# Altium footprint library MyComponents_v2.5.PcbLib: 403 footprints (part 24 of 26)
Each footprint in its own frame and in the unit in brackets; x right, y up, seen from the top. Pads: shape width x height; smd on the part's side, far side on the other; paste and mask are expansions set on the pad; w line width, h text height; cw(c..) or ccw(c..) is an arc to the next point about the centre after c.
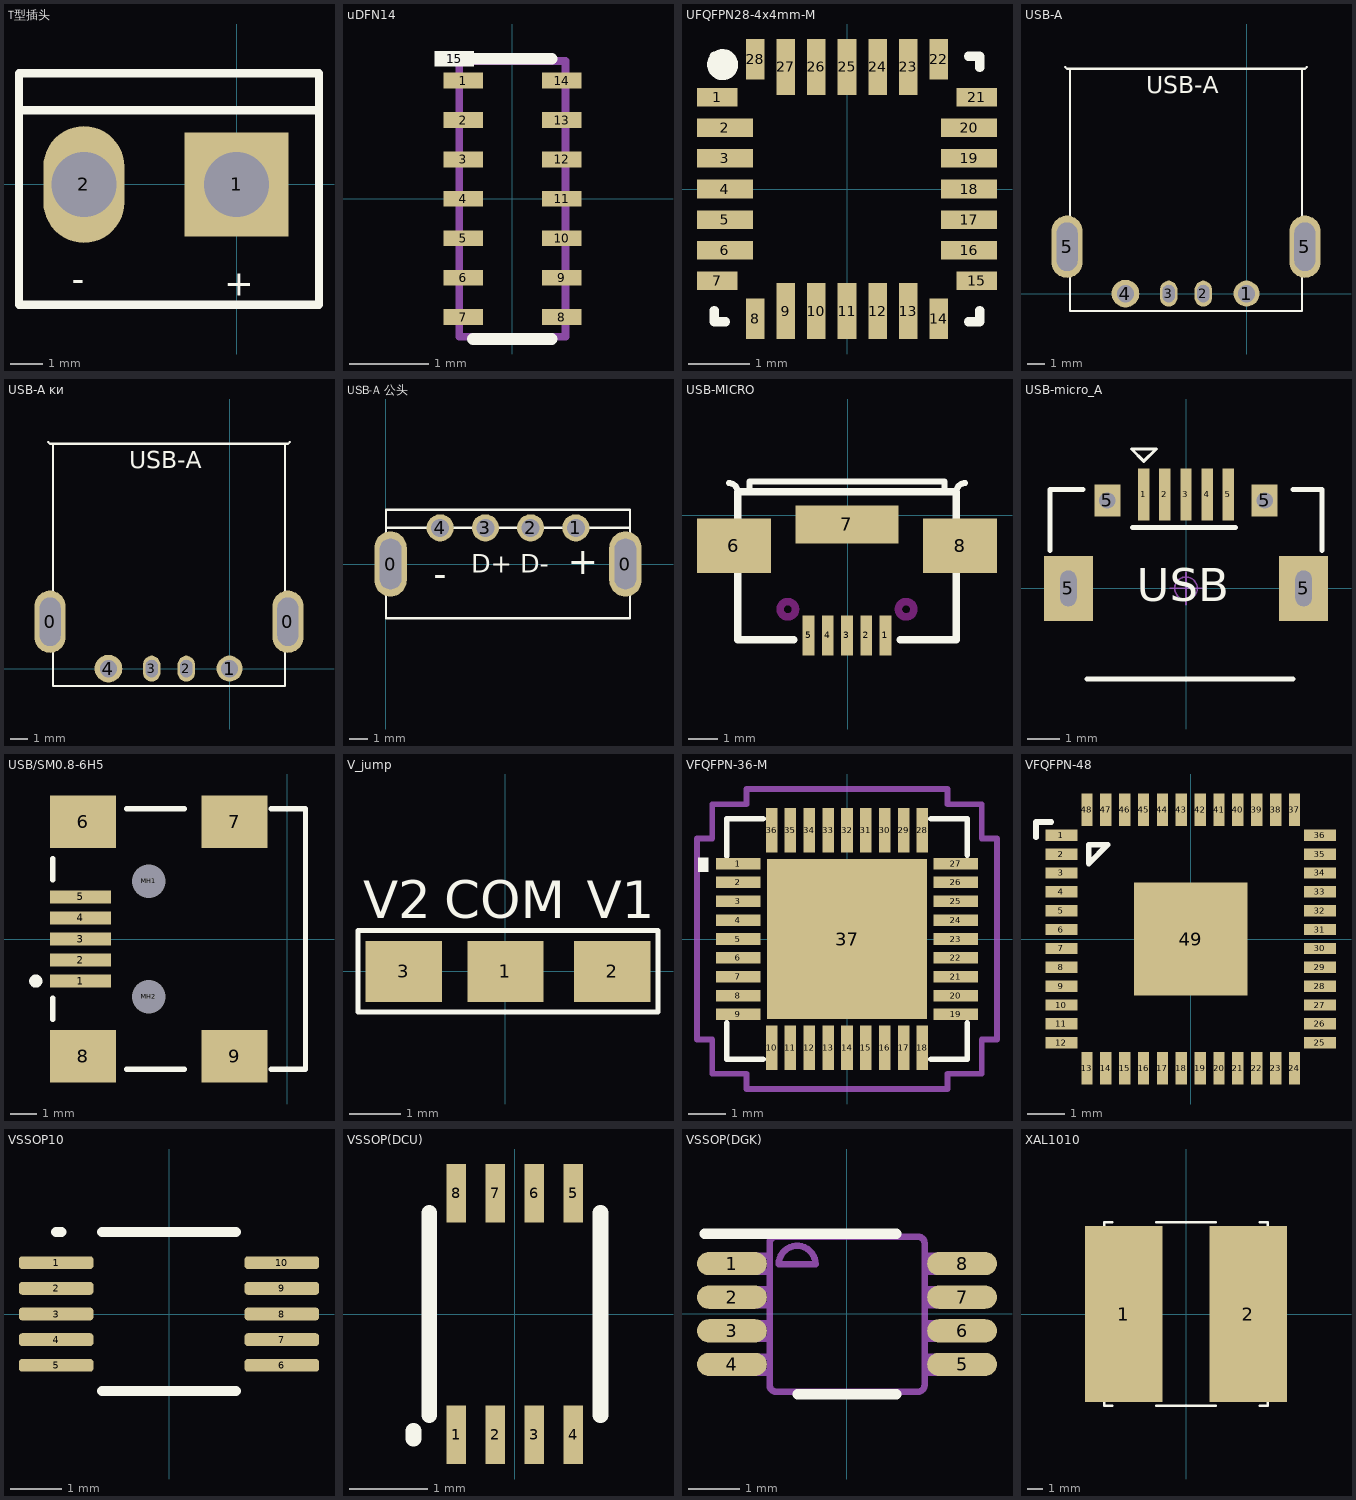
[diagram p23: the footprints below, top view; thin cyan lines are the x and y axes]

## T型插头 [mm]
pads (2):
  rect 3.2x3.2 hole 2: 1(0,0)
  oval 2.5x3.6 hole 2: 2(-4.699,0)
Top Overlay:
  lines w0.254: -6.7,2.286 2.54,2.286 ; -6.7,3.427 -6.7,-3.708 2.54,-3.708 2.54,3.429 -6.7,3.429
  text "+" at -0.381,-3.429 h0.8
  text "-" at -5.08,-3.302 h0.8

## uDFN14 [mm]
pads (15):
  rect 0.5x0.2 smd: 1(-0.625,1.5) 2(-0.625,1) 3(-0.625,0.5) 4(-0.625,0) 5(-0.625,-0.5) 6(-0.625,-1) 7(-0.625,-1.5) 8(0.625,-1.5) 9(0.625,-1) 10(0.625,-0.5) 11(0.625,0) 12(0.625,0.5) 13(0.625,1) 14(0.625,1.5)
  rect 0.5x0.2 on Top Overlay: 15(-0.737,1.778)
Top Overlay:
  lines w0.15: -0.8,1.778 0.5,1.778 ; -0.5,-1.778 0.5,-1.778
Mechanical 13:
  lines w0.1: -0.675,-1.75 0.675,-1.75 0.675,1.75 -0.675,1.75 -0.675,-1.75
3D body: height 0.5, standoff 0.1, extent -0.675,-1.75 0.675,1.75

## UFQFPN28-4x4mm-M [mil]
pads (28):
  rect 26x12 smd paste+0 mask+0: 1(-83.5,59.06) 7(-83.5,-59.06) 15(83.5,-59.06) 21(83.5,59.06)
  rect 36x12 smd paste+0 mask+0: 2(-78.5,39.37) 3(-78.5,19.68) 4(-78.5,0) 5(-78.5,-19.68) 6(-78.5,-39.37) 16(78.5,-39.37) 17(78.5,-19.68) 18(78.5,0) 19(78.5,19.68) 20(78.5,39.37)
  rect 12x26 smd paste+0 mask+0: 8(-59.06,-83.5) 14(59.06,-83.5) 22(59.06,83.5) 28(-59.06,83.5)
  rect 12x36 smd paste+0 mask+0: 9(-39.37,-78.5) 10(-19.68,-78.5) 11(0,-78.5) 12(19.68,-78.5) 13(39.37,-78.5) 23(39.37,78.5) 24(19.68,78.5) 25(0,78.5) 26(-19.68,78.5) 27(-39.37,78.5)
Top Overlay:
  circle w10: c-80,80 r5
  lines w6: -85.5,-78.16 -85.5,-85.5 -78.16,-85.5 ; -85.5,78.16 -85.5,85.5 -78.16,85.5 ; 78.16,-85.5 85.5,-85.5 85.5,-78.16 ; 78.16,85.5 85.5,85.5 85.5,78.16
3D body "UFQFPN28.step": height 21.65, standoff -0.98, extent -78.5,-79.13 79.77,79.14

## USB-A [mm]
pads (6):
  round 1.5 hole 1: 1(0,0)
  oval 1x1.5 hole 0.7 slot 1 at 90 deg: 2(-2.5,0) 3(-4.5,0)
  round 1.6 hole 1: 4(-7,0)
  oval 1.8x3.6 hole 1.2 slot 2.8 at 90 deg: 5(-10.373,2.71) 5(3.373,2.71)
Top Overlay:
  lines w0.127: -10.485,13.097 -10.388,13 -10.3,13 -10.2,13 ; 3.485,13.097 3.388,13 3.3,13 3.2,13 ; -10.2,13 -10.2,-1 3.2,-1 3.2,13 ; -10.2,13 3.2,13
  text "USB-A" at -5.786,11.573 h1
Bottom Overlay:
  text "GND" at -6.294,1.032 h0.5
  text "D+" at -4.262,1.032 h0.5
  text "D-" at -2.23,1.032 h0.5
  text "VCC" at 0.564,1.032 h0.5

## USB-A ĸͷ [mm]
pads (6):
  oval 1.8x3.6 hole 1.2 slot 2.8 at 90 deg: 0(-10.373,2.71) 0(3.373,2.71)
  round 1.5 hole 1: 1(0,0)
  oval 1x1.5 hole 0.7 slot 1 at 90 deg: 2(-2.5,0) 3(-4.5,0)
  round 1.6 hole 1: 4(-7,0)
Top Overlay:
  lines w0.127: -10.485,13.097 -10.388,13 -10.3,13 -10.2,13 ; 3.485,13.097 3.388,13 3.3,13 3.2,13 ; -10.2,13 -10.2,-1 3.2,-1 3.2,13 ; -10.2,13 3.2,13
  text "USB-A" at -5.786,11.573 h1
Bottom Overlay:
  text "GND" at -6.294,1.032 h0.5
  text "D+" at -4.262,1.032 h0.5
  text "D-" at -2.23,1.032 h0.5
  text "VCC" at 0.564,1.032 h0.5

## USB-A 公头 [mm]
pads (6):
  oval 1.8x3.6 hole 1.2 slot 2.8 at 90 deg: 0(0.254,0) 0(13.246,0)
  round 1.5 hole 1: 1(10.5,2) 2(8,2) 3(5.5,2) 4(3,2)
Top Overlay:
  lines w0.127: 0,2 13.5,2 ; 0,2 0,3 13.5,3 13.5,2 ; 0,2 0,-3 13.5,-3 13.5,2
  text "-" at 3.353,0.32 h2.54
  text "D+" at 4.724,-0.838 h1.78
  text "D-" at 7.417,-0.838 h1.78
  text "+" at 10.058,-1.069 h2.54
3D body "USB-A.stp": height 4.5, standoff -1.3, extent 0.4,-17.803 13.005,2.122

## USB-MICRO [mm]
pads (8):
  rect 0.4x1.35 smd: 1(1.27,-4.064) 2(0.62,-4.064) 3(-0.03,-4.064) 4(-0.68,-4.064) 5(-1.33,-4.064)
  rect 2.5x1.85 smd: 6(-3.855,-1.034) 8(3.795,-1.034)
  rect 3.5x1.3 smd: 7(-0.03,-0.314)
Top Overlay:
  lines w0.2: -4.03,1.086 cw(c-4.03,0.786) -3.73,0.786 ; -3.33,0.786 -3.33,1.136 3.27,1.136 3.27,0.786 ; 3.67,0.786 cw(c3.97,0.786) 3.97,1.086
  lines w0.254: -1.83,-4.214 -3.73,-4.214 -3.73,0.786 3.67,0.786 3.67,-4.214 1.77,-4.214
Bottom Overlay:
  lines w0.254: -4.13,0.586 4.07,0.586 ; -4.13,-4.214 4.07,-4.214 4.07,1.186 -4.13,1.186 -4.13,-4.214
Keep-Out Layer:
  circle w0.254: c-2.03,-3.184 r0.26
  circle w0.254: c1.97,-3.184 r0.26

## USB-micro_A [mm] "micro型USB ，5.7*7.8*2.5mm"
pads (9):
  rect 0.35x1.6 smd: 1(-1.3,2.9) 2(-0.65,2.9) 3(0,2.9) 4(0.65,2.9) 5(1.3,2.9)
  rect 1.5x2 hole 0.5 slot 1.1 at 90 deg: 5(-3.625,0) 5(3.625,0)
  rect 0.8x1 hole 0.5: 5(-2.425,2.71) 5(2.425,2.71)
Top Overlay:
  lines w0.1: -1.681,4.297 -1.3,3.916 -0.919,4.297 -1.681,4.297
  lines w0.152: -4.191,1.168 -4.191,3.048 -3.175,3.048 ; -3.048,-2.794 3.302,-2.794 ; -1.65,1.875 1.525,1.875 ; 3.302,3.048 4.191,3.048 4.191,1.168
  text "USB" at -1.524,-0.402 h1.02
Mechanical 15:
  circle w0.05: c0,0 r0.35
  lines w0.05: -0.5,0 0.5,0 ; 0,-0.5 0,0.5
3D body "USB micro_A.STEP": height 2.8, standoff -0.95, extent -4.001,-2.71 4.001,2.89

## USB/SM0.8-6H5 [mm]
pads (11):
  rect 2.3x0.5 smd: 1(-7.85,-1.6) 2(-7.85,-0.8) 3(-7.85,0) 4(-7.85,0.8) 5(-7.85,1.6)
  rect 2.5x2 smd: 6(-7.75,4.45) 7(-1.996,4.45) 8(-7.75,-4.45) 9(-1.996,-4.45)
  round 0.6 hole 1.27 unplated: MH1(-5.25,2.2) MH2(-5.25,-2.2)
Top Overlay:
  circle w0.25: c-9.55,-1.6 r0.125
  lines w0.2: -8.9,-3.05 -8.9,-2.25 ; -8.9,2.25 -8.9,3.05 ; -6.1,-4.95 -3.9,-4.95 ; -6.1,4.95 -3.9,4.95 ; -0.6,-4.95 0.7,-4.95 0.7,4.95 -0.6,4.95

## V_jump [mm]
pads (3):
  rect 1.5x1.2 smd: 1(0,0) 2(2.1,0) 3(-2,0)
Top Overlay:
  lines w0.1: -2.9,-0.8 3,-0.8 3,0.8 -2.9,0.8 -2.9,-0.8
  text "COM" at -1.2,0.8 h1.27
  text "V2" at -2.8,0.8 h1.27
  text "V1" at 1.6,0.8 h1.27

## VFQFPN-36-M [mil]
pads (37):
  rect 46x12 smd: 1(-113.5,78.74) 2(-113.5,59.06) 3(-113.5,39.37) 4(-113.5,19.68) 5(-113.5,0) 6(-113.5,-19.68) 7(-113.5,-39.37) 8(-113.5,-59.06) 9(-113.5,-78.74) 19(113.5,-78.74) 20(113.5,-59.06) 21(113.5,-39.37) 22(113.5,-19.68) 23(113.5,0) 24(113.5,19.68) 25(113.5,39.37) 26(113.5,59.06) 27(113.5,78.74)
  rect 12x46 smd: 10(-78.74,-113.5) 11(-59.06,-113.5) 12(-39.37,-113.5) 13(-19.68,-113.5) 14(0,-113.5) 15(19.68,-113.5) 16(39.37,-113.5) 17(59.06,-113.5) 18(78.74,-113.5) 28(78.74,113.5) 29(59.06,113.5) 30(39.37,113.5) 31(19.68,113.5) 32(0,113.5) 33(-19.68,113.5) 34(-39.37,113.5) 35(-59.06,113.5) 36(-78.74,113.5)
  rect 167x167 smd paste-83: 37(0,0)
Top Overlay:
  region: -155,85 -145,85 -145,70 -155,70
  lines w6: -125.5,-87.74 -125.5,-125.5 -87.74,-125.5 ; -125.5,86.61 -125.5,125.5 -87.74,125.5 ; 87.74,-125.5 125.5,-125.5 125.5,-87.74 ; 87.74,125.5 125.5,125.5 125.5,87.74
Top Paste:
  region: -31.77,79.56 -79.56,79.56 -79.56,31.77 -31.77,31.77
  region: -31.77,23.9 -79.56,23.9 -79.56,-23.9 -31.77,-23.9
  region: -31.77,-31.77 -79.56,-31.77 -79.56,-79.56 -31.77,-79.56
  region: 23.9,79.56 -23.9,79.56 -23.9,31.77 23.9,31.77
  region: 23.9,23.9 -23.9,23.9 -23.9,-23.9 23.9,-23.9
  region: 23.9,-31.77 -23.9,-31.77 -23.9,-79.56 23.9,-79.56
  region: 79.56,79.56 31.77,79.56 31.77,31.77 79.56,31.77
  region: 79.56,23.9 31.77,23.9 31.77,-23.9 79.56,-23.9
  region: 79.56,-31.77 31.77,-31.77 31.77,-79.56 79.56,-79.56
Mechanical 15:
  lines w6: -156.5,-104.74 -140.5,-104.74 -140.5,-140.5 -104.74,-140.5 -104.74,-156.5 104.74,-156.5 104.74,-140.5 140.5,-140.5 140.5,-104.74 156.5,-104.74 156.5,104.74 140.5,104.74 140.5,140.5 104.74,140.5 104.74,156.5 -104.74,156.5 -104.74,140.5 -140.5,140.5 -140.5,104.74 -156.5,104.74 -156.5,-104.74
3D body "VFQFPN-36-M.stp": height 37.1, standoff 0, extent -122.5,-122.5 122.5,122.5

## VFQFPN-48 [mm]
pads (49):
  rect 0.85x0.3 smd: 1(-3.425,2.75) 2(-3.425,2.25) 3(-3.425,1.75) 4(-3.425,1.25) 5(-3.425,0.75) 6(-3.425,0.25) 7(-3.425,-0.25) 8(-3.425,-0.75) 9(-3.425,-1.25) 10(-3.425,-1.75) 11(-3.425,-2.25) 12(-3.425,-2.75) 25(3.425,-2.75) 26(3.425,-2.25) 27(3.425,-1.75) 28(3.425,-1.25) 29(3.425,-0.75) 30(3.425,-0.25) 31(3.425,0.25) 32(3.425,0.75) 33(3.425,1.25) 34(3.425,1.75) 35(3.425,2.25) 36(3.425,2.75)
  rect 0.3x0.85 smd: 13(-2.75,-3.425) 14(-2.25,-3.425) 15(-1.75,-3.425) 16(-1.25,-3.425) 17(-0.75,-3.425) 18(-0.25,-3.425) 19(0.25,-3.425) 20(0.75,-3.425) 21(1.25,-3.425) 22(1.75,-3.425) 23(2.25,-3.425) 24(2.75,-3.425) 37(2.75,3.425) 38(2.25,3.425) 39(1.75,3.425) 40(1.25,3.425) 41(0.75,3.425) 42(0.25,3.425) 43(-0.25,3.425) 44(-0.75,3.425) 45(-1.25,3.425) 46(-1.75,3.425) 47(-2.25,3.425) 48(-2.75,3.425)
  rect 3x3 smd: 49(0,0)
Top Overlay:
  lines w0.15: -4.1,2.7 -4.1,3.1 -3.7,3.1 ; -2.7,2 -2.7,2.5 -2.2,2.5 -2.7,2
3D body "ALSRobot-QFN48 7x7.step": height 0.78, standoff -0.02, extent -3.51,-3.509 3.51,3.511

## VSSOP10 [mm]
pads (10):
  rrect50% 1.45x0.25 smd: 1(-2.2,1) 2(-2.2,0.5) 3(-2.2,0) 4(-2.2,-0.5) 5(-2.2,-1) 6(2.2,-1) 7(2.2,-0.5) 8(2.2,0) 9(2.2,0.5) 10(2.2,1)
Top Overlay:
  lines w0.2: -2.2,1.6 -2.1,1.6 ; -1.3,-1.5 1.3,-1.5 ; -1.3,1.6 1.3,1.6
3D body "VSSOP10.stp": height 1.06, standoff -0.04, extent -2.45,-1.51 2.475,1.49

## VSSOP(DCU) [mm] "TS5A3359"
height 0.9
pads (8):
  rect 0.25x0.75 smd: 1(-0.75,-1.55) 2(-0.25,-1.55) 3(0.25,-1.55) 4(0.75,-1.55) 5(0.75,1.55) 6(0.25,1.55) 7(-0.25,1.55) 8(-0.75,1.55)
Top Overlay:
  lines w0.2: -1.3,-1.6 -1.3,-1.5 ; -1.1,-1.3 -1.1,1.3 ; 1.1,-1.3 1.1,1.3
3D body "VSSOP.step": height 0.9, standoff 0, extent -1.05,-1.625 1.05,1.575

## VSSOP(DGK) [mm]
pads (8):
  oval 1.35x0.45 smd paste+0 mask+0: 1(-2.225,0.975) 2(-2.225,0.325) 3(-2.225,-0.325) 4(-2.225,-0.975) 5(2.225,-0.975) 6(2.225,-0.325) 7(2.225,0.325) 8(2.225,0.975)
Top Overlay:
  lines w0.2: -2.75,1.55 0.95,1.55 ; -0.95,-1.55 0.95,-1.55
Mechanical 13:
  lines w0.127: -2.45,-1.131 -2.45,-0.826 -2.21,-0.826 -2.091,-0.826 -2.087,-0.826 -1.784,-0.826 -1.498,-0.826 -1.498,-1.131 -1.784,-1.131 -2.087,-1.131 -2.091,-1.131 -2.21,-1.131 -2.45,-1.131 ; -2.45,-0.48 -2.45,-0.175 -2.21,-0.175 -2.091,-0.175 -2.087,-0.175 -1.784,-0.175 -1.498,-0.175 -1.498,-0.48 -1.784,-0.48 -2.087,-0.48 -2.091,-0.48 -2.21,-0.48 -2.45,-0.48 ; -2.45,0.17 -2.45,0.475 -2.21,0.475 -2.091,0.475 -2.087,0.475 -1.784,0.475 -1.498,0.475 -1.498,0.17 -1.784,0.17 -2.087,0.17 -2.091,0.17 -2.21,0.17 -2.45,0.17 ; -2.45,0.82 -2.45,1.125 -2.21,1.125 -2.091,1.125 -2.087,1.125 -1.784,1.125 -1.498,1.125 -1.498,0.82 -1.784,0.82 -2.087,0.82 -2.091,0.82 -2.21,0.82 -2.45,0.82 ; -1.497,-1.377 ccw(c-1.37,-1.374) -1.373,-1.501 -1.371,-1.501 1.373,-1.501 1.375,-1.501 ccw(c1.373,-1.374) 1.5,-1.377 1.5,-1.374 1.5,1.369 1.5,1.372 ccw(c1.373,1.369) 1.375,1.496 1.373,1.496 -1.371,1.496 -1.373,1.496 ccw(c-1.37,1.369) -1.497,1.372 -1.498,1.369 -1.498,-1.374 -1.497,-1.377 ; -1.32,0.962 cw(c-0.964,0.962) -0.609,0.962 -1.32,0.962 ; 1.5,-1.131 1.786,-1.131 2.089,-1.131 2.093,-1.131 2.213,-1.131 2.452,-1.131 2.452,-0.826 2.213,-0.826 2.093,-0.826 2.089,-0.826 1.786,-0.826 1.5,-0.826 1.5,-1.131 ; 1.5,-0.48 1.786,-0.48 2.089,-0.48 2.093,-0.48 2.213,-0.48 2.452,-0.48 2.452,-0.175 2.213,-0.175 2.093,-0.175 2.089,-0.175 1.786,-0.175 1.5,-0.175 1.5,-0.48 ; 1.5,0.17 1.786,0.17 2.089,0.17 2.093,0.17 2.213,0.17 2.452,0.17 2.452,0.475 2.213,0.475 2.093,0.475 2.089,0.475 1.786,0.475 1.5,0.475 1.5,0.17 ; 1.5,0.82 1.786,0.82 2.089,0.82 2.093,0.82 2.213,0.82 2.452,0.82 2.452,1.125 2.213,1.125 2.093,1.125 2.089,1.125 1.786,1.125 1.5,1.125 1.5,0.82
3D body "VSSOP2.stp": height 0.97, standoff 0, extent -2.451,-1.498 2.451,1.499

## XAL1010 [mm]
pads (2):
  rect 5x11.303 smd: 1(-4,0) 2(4,0)
Top Overlay:
  lines w0.152: -4.736,-5.905 -5.258,-5.905 -5.258,5.905 -4.736,5.905 ; -1.919,-5.905 1.919,-5.905 ; -1.919,5.905 1.919,5.905 ; 4.736,-5.905 5.258,-5.905 5.258,5.905 4.736,5.905
3D body "Coilcraft-XAL1010.step": height 10, standoff 0, extent -5.377,-5.9 5.123,5.9